# Altium footprint library AltiumDesignerLibraries.PcbLib: 313 footprints (part 6 of 20)
Each footprint in its own frame and in the unit in brackets; x right, y up, seen from the top. Pads: shape width x height; smd on the part's side, far side on the other; paste and mask are expansions set on the pad; w line width, h text height; cw(c..) or ccw(c..) is an arc to the next point about the centre after c.
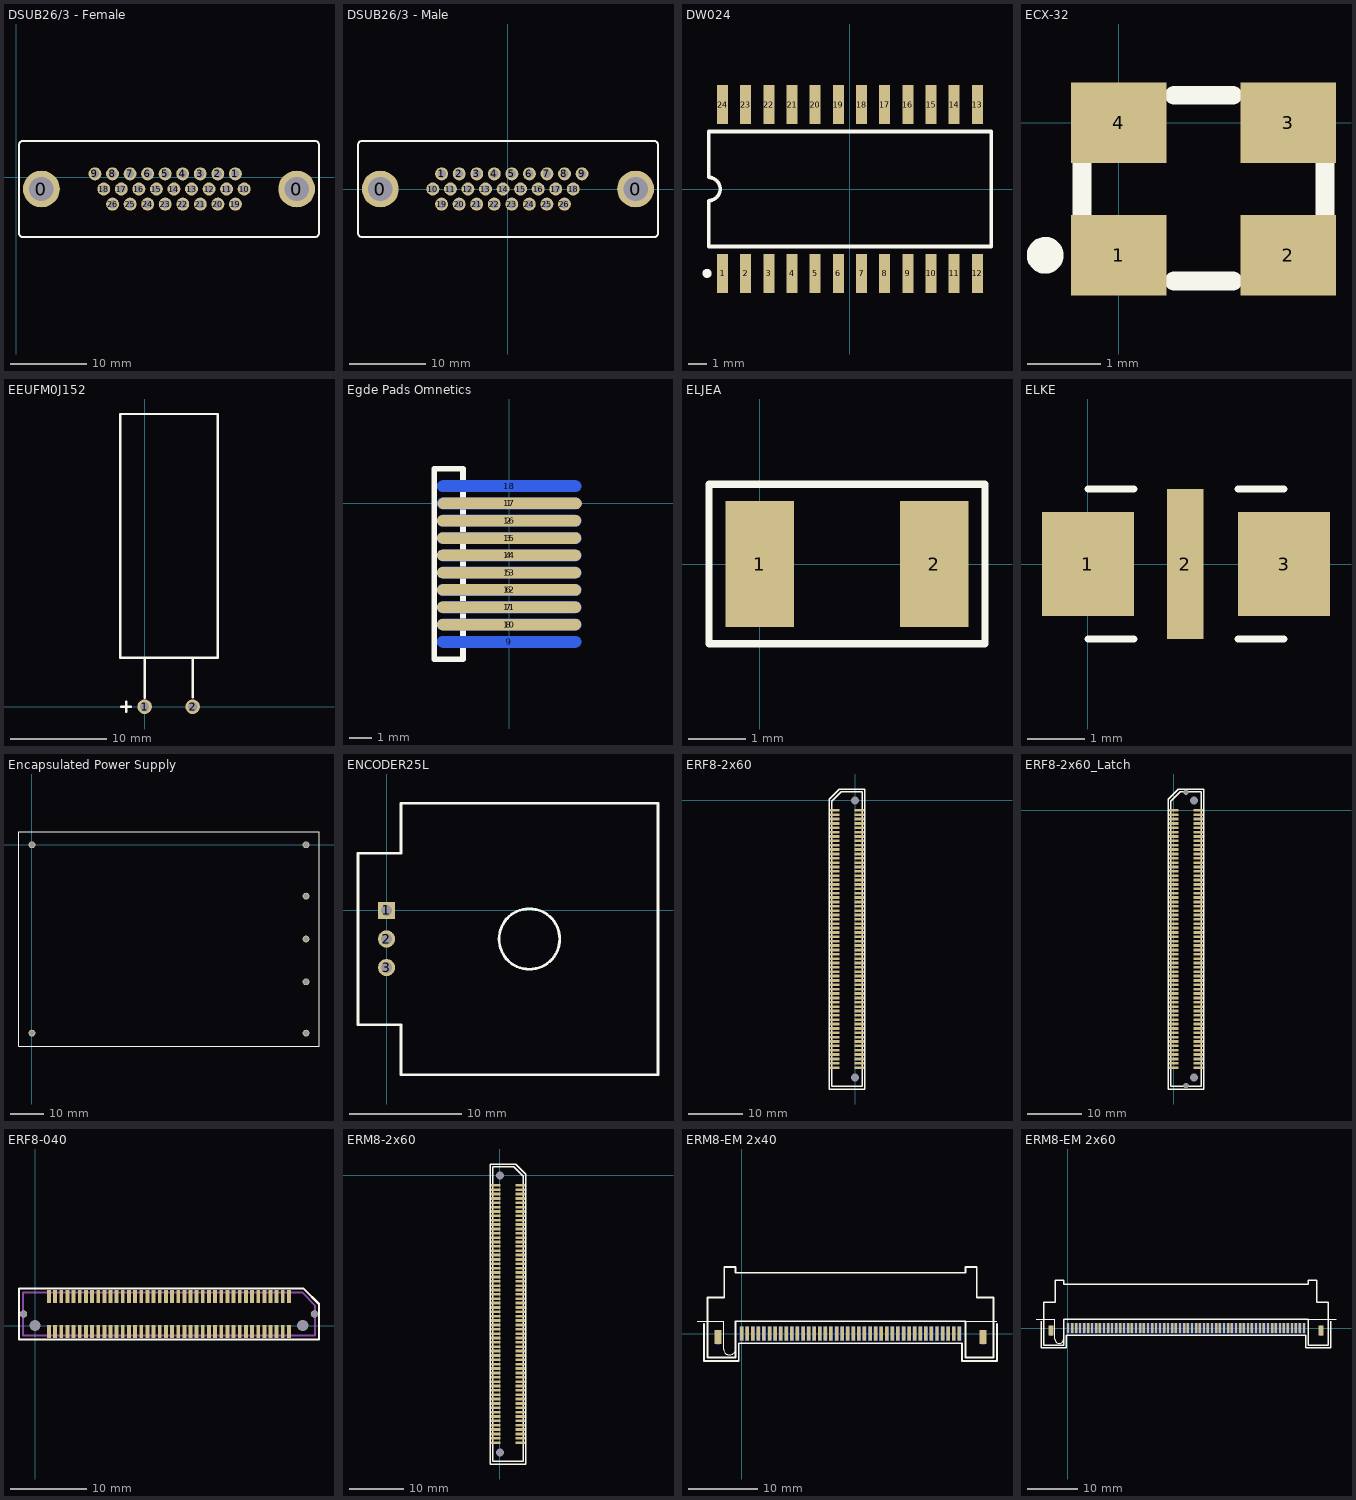
[diagram p5: the footprints below, top view; thin cyan lines are the x and y axes]

## DSUB26/3 - Female [mm]
pads (28):
  round 4.8 hole 3.18: 0(3.304,-1.549) 0(36.624,-1.549)
  round 1.69 hole 1.09: 1(28.614,0.431) 2(26.324,0.431) 3(24.034,0.431) 4(21.744,0.431) 5(19.454,0.431) 6(17.164,0.431) 7(14.874,0.431) 8(12.584,0.431) 9(10.294,0.431) 10(29.764,-1.549) 11(27.474,-1.549) 12(25.184,-1.549) 13(22.894,-1.549) 14(20.604,-1.549) 15(18.314,-1.549) 16(16.024,-1.549) 17(13.734,-1.549) 18(11.444,-1.549) 19(28.624,-3.529) 20(26.334,-3.529) 21(24.044,-3.529) 22(21.754,-3.529) 23(19.464,-3.529) 24(17.174,-3.529) 25(14.884,-3.529) 26(12.594,-3.529)
Top Overlay:
  lines w0.254: 0.38,-7.341 ccw(c0.864,-7.341) 0.889,-7.823 ; 0.381,4.19 cw(c0.902,4.204) 0.889,4.724 ; 0.394,-7.316 0.394,4.218 ; 0.902,-7.824 39.026,-7.824 ; 0.902,4.726 39.026,4.726 ; 39.014,-7.823 ccw(c39.014,-7.315) 39.522,-7.315 ; 39.014,4.724 cw(c39.027,4.229) 39.522,4.242 ; 39.534,-7.316 39.534,4.218

## DSUB26/3 - Male [mm] "Male connector"
pads (28):
  round 4.8 hole 3.18: 0(-16.66,0) 0(16.66,0)
  round 1.69 hole 1.09: 1(-8.65,1.98) 2(-6.36,1.98) 3(-4.07,1.98) 4(-1.78,1.98) 5(0.51,1.98) 6(2.8,1.98) 7(5.09,1.98) 8(7.38,1.98) 9(9.67,1.98) 10(-9.8,0) 11(-7.51,0) 12(-5.22,0) 13(-2.93,0) 14(-0.64,0) 15(1.65,0) 16(3.94,0) 17(6.23,0) 18(8.52,0) 19(-8.66,-1.98) 20(-6.37,-1.98) 21(-4.08,-1.98) 22(-1.79,-1.98) 23(0.5,-1.98) 24(2.79,-1.98) 25(5.08,-1.98) 26(7.37,-1.98)
Top Overlay:
  lines w0.254: -19.57,-5.767 -19.57,5.767 ; -19.558,-5.766 ccw(c-19.05,-5.766) -19.05,-6.274 ; -19.558,5.791 cw(c-19.063,5.779) -19.05,6.274 ; -19.062,-6.275 19.062,-6.275 ; -19.062,6.275 19.062,6.275 ; 19.075,-6.274 ccw(c19.101,-5.791) 19.584,-5.791 ; 19.075,6.274 cw(c19.063,5.753) 19.583,5.74 ; 19.57,-5.767 19.57,5.767

## DW024 [mm]
pads (24):
  rect 0.6x2.15 smd: 1(-6.985,-4.625) 2(-5.715,-4.625) 3(-4.445,-4.625) 4(-3.175,-4.625) 5(-1.905,-4.625) 6(-0.635,-4.625) 7(0.635,-4.625) 8(1.905,-4.625) 9(3.175,-4.625) 10(4.445,-4.625) 11(5.715,-4.625) 12(6.985,-4.625) 13(6.985,4.625) 14(5.715,4.625) 15(4.445,4.625) 16(3.175,4.625) 17(1.905,4.625) 18(0.635,4.625) 19(-0.635,4.625) 20(-1.905,4.625) 21(-3.175,4.625) 22(-4.445,4.625) 23(-5.715,4.625) 24(-6.985,4.625)
Top Overlay:
  circle w0.25: c-7.835,-4.625 r0.125
  lines w0.2: -7.75,-3.15 -7.75,-0.635 ccw(c-7.75,0) -7.75,0.635 -7.75,3.15 7.75,3.15 7.75,-3.15 -7.75,-3.15

## ECX-32 [mm] "Crystal"
pads (4):
  rect 1.3x1.1 smd: 1(0,-1.8) 2(2.3,-1.8) 3(2.3,0) 4(0,0)
Top Overlay:
  circle w0.25: c-1,-1.8 r0.125
  lines w0.254: -0.5,-2.025 -0.5,0.25 ; 0.75,-2.15 1.55,-2.15 ; 0.75,0.375 1.55,0.375 ; 2.8,-2.025 2.8,0.25

## EEUFM0J152 [mil] "Radial Cap thru-hole mounted on its side"
pads (2):
  round 60 hole 38: 1(0,0) 2(196.85,0)
Top Overlay:
  lines w10: -96,0 -56,0 ; -76,-20 -76,20 ; 0,200 1,199 1,37 ; 197,38 197,196 201,200 ; -100,200 300,200 300,1200 -100,1200 -100,200

## Egde Pads Omnetics [mil]
pads (18):
  oval 250x20 smd: 1(1,0) 2(0,-30) 3(0,-60) 4(0,-90) 5(0,-120) 6(0,-150) 7(0,-180) 8(0,-210)
  oval 250x20 smd far side: 9(0,-240) 10(0,-210) 11(0,-180) 12(0,-150) 13(0,-120) 14(0,-90) 15(0,-60) 16(0,-30) 17(0,0) 18(0,30)
Top Overlay:
  lines w10: -130,-270 -130,60 -80,60 -80,-270 -130,-270

## ELJEA [mm]
pads (2):
  rect 1.2x2.2 smd: 1(0,0) 2(3.048,0)
Top Overlay:
  lines w0.127: -0.889,-1.397 3.937,-1.397 3.937,1.397 -0.889,1.397 -0.889,-1.397

## ELKE [mm]
pads (3):
  rect 1.6x1.8 smd: 1(0,0) 3(3.4,0)
  rect 0.635x2.6 smd: 2(1.69,0)
Top Overlay:
  lines w0.127: 0,-1.3 0.8,-1.3 ; 0,1.3 0.8,1.3 ; 2.6,-1.3 3.4,-1.3 ; 2.6,1.3 3.4,1.3

## Encapsulated Power Supply [mil] "PCB mountable power supply 89mmX63.5mm"
pads (7):
  round 80 hole 60: 1(0,0) 2(0,-2200) 3(3200.79,0) 4(3200.79,-600) 5(3200.79,-1600) 5(3200.79,-1100) 7(3200.79,-2200)
Top Overlay:
  lines w10: -151.57,-2350.39 -151.57,150 3352.36,150 3352.36,-2350.39 -151.57,-2350.39

## ENCODER25L [mil] "Grayhill series 25L rotary encoder"
pads (3):
  rect 60x60 hole 38: 1(0,0)
  round 60 hole 38: 2(0,-100) 3(0,-200)
Top Overlay:
  circle w10: c500,-100 r106.07
  lines w10: -100,-400 -100,200 50,200 50,375 950,375 950,-575 50,-575 50,-400 -100,-400

## ERF8-2x60 [mm]
pads (122):
  rect 1.778x0.5 smd mask+0.05: 1(-3.739,-1.8) 2(0.737,-1.8) 3(-3.739,-2.6) 4(0.737,-2.6) 5(-3.739,-3.4) 6(0.737,-3.4) 7(-3.739,-4.2) 8(0.737,-4.2) 9(-3.739,-5) 10(0.737,-5) 11(-3.739,-5.8) 12(0.737,-5.8) 13(-3.739,-6.6) 14(0.737,-6.6) 15(-3.739,-7.4) 16(0.737,-7.4) 17(-3.739,-8.2) 18(0.737,-8.2) 19(-3.739,-9) 20(0.737,-9) 21(-3.739,-9.8) 22(0.737,-9.8) 23(-3.739,-10.6) 24(0.737,-10.6) 25(-3.739,-11.4) 26(0.737,-11.4) 27(-3.739,-12.2) 28(0.737,-12.2) 29(-3.739,-13) 30(0.737,-13) 31(-3.739,-13.8) 32(0.737,-13.8) 33(-3.739,-14.6) 34(0.737,-14.6) 35(-3.739,-15.4) 36(0.737,-15.4) 37(-3.739,-16.2) 38(0.737,-16.2) 39(-3.739,-17) 40(0.737,-17) 41(-3.739,-17.8) 42(0.737,-17.8) 43(-3.739,-18.6) 44(0.737,-18.6) 45(-3.739,-19.4) 46(0.737,-19.4) 47(-3.739,-20.2) 48(0.737,-20.2) 49(-3.739,-21) 50(0.737,-21) 51(-3.739,-21.8) 52(0.737,-21.8) 53(-3.739,-22.6) 54(0.737,-22.6) 55(-3.739,-23.4) 56(0.737,-23.4) 57(-3.739,-24.2) 58(0.737,-24.2) 59(-3.739,-25) 60(0.737,-25) 61(-3.739,-25.8) 62(0.737,-25.8) 63(-3.739,-26.6) 64(0.737,-26.6) 65(-3.739,-27.4) 66(0.737,-27.4) 67(-3.739,-28.2) 68(0.737,-28.2) 69(-3.739,-29) 70(0.737,-29) 71(-3.739,-29.8) 72(0.737,-29.8) 73(-3.739,-30.6) 74(0.737,-30.6) 75(-3.739,-31.4) 76(0.737,-31.4) 77(-3.739,-32.2) 78(0.737,-32.2) 79(-3.739,-33) 80(0.737,-33) 81(-3.739,-33.8) 82(0.737,-33.8) 83(-3.739,-34.6) 84(0.737,-34.6) 85(-3.739,-35.4) 86(0.737,-35.4) 87(-3.739,-36.2) 88(0.737,-36.2) 89(-3.739,-37) 90(0.737,-37) 91(-3.739,-37.8) 92(0.737,-37.8) 93(-3.739,-38.6) 94(0.737,-38.6) 95(-3.739,-39.4) 96(0.737,-39.4) 97(-3.739,-40.2) 98(0.737,-40.2) 99(-3.739,-41) 100(0.737,-41) 101(-3.739,-41.8) 102(0.737,-41.8) 103(-3.739,-42.6) 104(0.737,-42.6) 105(-3.739,-43.4) 106(0.737,-43.4) 107(-3.739,-44.2) 108(0.737,-44.2) 109(-3.739,-45) 110(0.737,-45) 111(-3.739,-45.8) 112(0.737,-45.8) 113(-3.739,-46.6) 114(0.737,-46.6) 115(-3.739,-47.4) 116(0.737,-47.4) 117(-3.739,-48.2) 118(0.737,-48.2) 119(-3.739,-49) 120(0.737,-49)
  round 0 hole 1.45 unplated mask+0.975: 121(0,0) 122(0,-50.8)
Top Overlay:
  lines w0.25: -4.8,-52.908 -4.8,0.2 -2.9,2.108 1.8,2.108 1.8,-52.908 -4.8,-52.908 ; -4.3,-52.4 -4.3,-0.1 -2.6,1.6 1.3,1.6 1.3,-52.4 -4.3,-52.4

## ERF8-2x60_Latch [mm] "Female high density header 120 positions"
pads (124):
  rect 1.778x0.5 smd mask+0.05: 1(0,0) 2(4.476,0) 3(0,-0.8) 4(4.476,-0.8) 5(0,-1.6) 6(4.476,-1.6) 7(0,-2.4) 8(4.476,-2.4) 9(0,-3.2) 10(4.476,-3.2) 11(0,-4) 12(4.476,-4) 13(0,-4.8) 14(4.476,-4.8) 15(0,-5.6) 16(4.476,-5.6) 17(0,-6.4) 18(4.476,-6.4) 19(0,-7.2) 20(4.476,-7.2) 21(0,-8) 22(4.476,-8) 23(0,-8.8) 24(4.476,-8.8) 25(0,-9.6) 26(4.476,-9.6) 27(0,-10.4) 28(4.476,-10.4) 29(0,-11.2) 30(4.476,-11.2) 31(0,-12) 32(4.476,-12) 33(0,-12.8) 34(4.476,-12.8) 35(0,-13.6) 36(4.476,-13.6) 37(0,-14.4) 38(4.476,-14.4) 39(0,-15.2) 40(4.476,-15.2) 41(0,-16) 42(4.476,-16) 43(0,-16.8) 44(4.476,-16.8) 45(0,-17.6) 46(4.476,-17.6) 47(0,-18.4) 48(4.476,-18.4) 49(0,-19.2) 50(4.476,-19.2) 51(0,-20) 52(4.476,-20) 53(0,-20.8) 54(4.476,-20.8) 55(0,-21.6) 56(4.476,-21.6) 57(0,-22.4) 58(4.476,-22.4) 59(0,-23.2) 60(4.476,-23.2) 61(0,-24) 62(4.476,-24) 63(0,-24.8) 64(4.476,-24.8) 65(0,-25.6) 66(4.476,-25.6) 67(0,-26.4) 68(4.476,-26.4) 69(0,-27.2) 70(4.476,-27.2) 71(0,-28) 72(4.476,-28) 73(0,-28.8) 74(4.476,-28.8) 75(0,-29.6) 76(4.476,-29.6) 77(0,-30.4) 78(4.476,-30.4) 79(0,-31.2) 80(4.476,-31.2) 81(0,-32) 82(4.476,-32) 83(0,-32.8) 84(4.476,-32.8) 85(0,-33.6) 86(4.476,-33.6) 87(0,-34.4) 88(4.476,-34.4) 89(0,-35.2) 90(4.476,-35.2) 91(0,-36) 92(4.476,-36) 93(0,-36.8) 94(4.476,-36.8) 95(0,-37.6) 96(4.476,-37.6) 97(0,-38.4) 98(4.476,-38.4) 99(0,-39.2) 100(4.476,-39.2) 101(0,-40) 102(4.476,-40) 103(0,-40.8) 104(4.476,-40.8) 105(0,-41.6) 106(4.476,-41.6) 107(0,-42.4) 108(4.476,-42.4) 109(0,-43.2) 110(4.476,-43.2) 111(0,-44) 112(4.476,-44) 113(0,-44.8) 114(4.476,-44.8) 115(0,-45.6) 116(4.476,-45.6) 117(0,-46.4) 118(4.476,-46.4) 119(0,-47.2) 120(4.476,-47.2)
  round 0 hole 1.45 unplated mask+0.975: 121(3.739,1.8) 122(3.739,-49)
  round 0.94 hole 0.889 unplated: 123(2.235,-50.495) 123(2.235,3.302)
Top Overlay:
  lines w0.25: -1.061,-51.108 5.539,-51.108 5.539,3.908 0.839,3.908 -1.061,2 -1.061,-51.108 ; -0.561,-50.6 5.039,-50.6 5.039,3.4 1.139,3.4 -0.561,1.7 -0.561,-50.6
3D body: height 5.42, standoff -1.07, extent -0.783,-50.603 5.217,3.397

## ERF8-040 [mm]
pads (84):
  rect 0.5x1.7 smd mask+0.05: 1(33,3.75) 2(33,-0.75) 3(32.2,3.75) 4(32.2,-0.75) 5(31.4,3.75) 6(31.4,-0.75) 7(30.6,3.75) 8(30.6,-0.75) 9(29.8,3.75) 10(29.8,-0.75) 11(29,3.75) 12(29,-0.75) 13(28.2,3.75) 14(28.2,-0.75) 15(27.4,3.75) 16(27.4,-0.75) 17(26.6,3.75) 18(26.6,-0.75) 19(25.8,3.75) 20(25.8,-0.75) 21(25,3.75) 22(25,-0.75) 23(24.2,3.75) 24(24.2,-0.75) 25(23.4,3.75) 26(23.4,-0.75) 27(22.6,3.75) 28(22.6,-0.75) 29(21.8,3.75) 30(21.8,-0.75) 31(21,3.75) 32(21,-0.75) 33(20.2,3.75) 34(20.2,-0.75) 35(19.4,3.75) 36(19.4,-0.75) 37(18.6,3.75) 38(18.6,-0.75) 39(17.8,3.75) 40(17.8,-0.75) 41(17,3.75) 42(17,-0.75) 43(16.2,3.75) 44(16.2,-0.75) 45(15.4,3.75) 46(15.4,-0.75) 47(14.6,3.75) 48(14.6,-0.75) 49(13.8,3.75) 50(13.8,-0.75) 51(13,3.75) 52(13,-0.75) 53(12.2,3.75) 54(12.2,-0.75) 55(11.4,3.75) 56(11.4,-0.75) 57(10.6,3.75) 58(10.6,-0.75) 59(9.8,3.75) 60(9.8,-0.75) 61(9,3.75) 62(9,-0.75) 63(8.2,3.75) 64(8.2,-0.75) 65(7.4,3.75) 66(7.4,-0.75) 67(6.6,3.75) 68(6.6,-0.75) 69(5.8,3.75) 70(5.8,-0.75) 71(5,3.75) 72(5,-0.75) 73(4.2,3.75) 74(4.2,-0.75) 75(3.4,3.75) 76(3.4,-0.75) 77(2.6,3.75) 78(2.6,-0.75) 79(1.8,3.75) 80(1.8,-0.75)
  round 0 hole 1.45 unplated: 81(34.8,0) 82(0,0)
  round 0.94 hole 0.889: 83(36.302,1.504) 84(-1.504,1.502)
Top Overlay:
  lines w0.25: -2.099,-1.8 -2.099,4.8 34.9,4.8 36.908,2.8 36.908,-1.8 -2.099,-1.8
Mechanical 2:
  lines w0.25: -1.6,-1.3 -1.6,4.3 34.7,4.3 36.4,2.6 36.4,-1.3 -1.6,-1.3

## ERM8-2x60 [mm] "Mirco Backplane header"
pads (122):
  rect 1.778x0.5 smd mask+0.05: 1(3.739,-1.8) 2(-0.737,-1.8) 3(3.739,-2.6) 4(-0.737,-2.6) 5(3.739,-3.4) 6(-0.737,-3.4) 7(3.739,-4.2) 8(-0.737,-4.2) 9(3.739,-5) 10(-0.737,-5) 11(3.739,-5.8) 12(-0.737,-5.8) 13(3.739,-6.6) 14(-0.737,-6.6) 15(3.739,-7.4) 16(-0.737,-7.4) 17(3.739,-8.2) 18(-0.737,-8.2) 19(3.739,-9) 20(-0.737,-9) 21(3.739,-9.8) 22(-0.737,-9.8) 23(3.739,-10.6) 24(-0.737,-10.6) 25(3.739,-11.4) 26(-0.737,-11.4) 27(3.739,-12.2) 28(-0.737,-12.2) 29(3.739,-13) 30(-0.737,-13) 31(3.739,-13.8) 32(-0.737,-13.8) 33(3.739,-14.6) 34(-0.737,-14.6) 35(3.739,-15.4) 36(-0.737,-15.4) 37(3.739,-16.2) 38(-0.737,-16.2) 39(3.739,-17) 40(-0.737,-17) 41(3.739,-17.8) 42(-0.737,-17.8) 43(3.739,-18.6) 44(-0.737,-18.6) 45(3.739,-19.4) 46(-0.737,-19.4) 47(3.739,-20.2) 48(-0.737,-20.2) 49(3.739,-21) 50(-0.737,-21) 51(3.739,-21.8) 52(-0.737,-21.8) 53(3.739,-22.6) 54(-0.737,-22.6) 55(3.739,-23.4) 56(-0.737,-23.4) 57(3.739,-24.2) 58(-0.737,-24.2) 59(3.739,-25) 60(-0.737,-25) 61(3.739,-25.8) 62(-0.737,-25.8) 63(3.739,-26.6) 64(-0.737,-26.6) 65(3.739,-27.4) 66(-0.737,-27.4) 67(3.739,-28.2) 68(-0.737,-28.2) 69(3.739,-29) 70(-0.737,-29) 71(3.739,-29.8) 72(-0.737,-29.8) 73(3.739,-30.6) 74(-0.737,-30.6) 75(3.739,-31.4) 76(-0.737,-31.4) 77(3.739,-32.2) 78(-0.737,-32.2) 79(3.739,-33) 80(-0.737,-33) 81(3.739,-33.8) 82(-0.737,-33.8) 83(3.739,-34.6) 84(-0.737,-34.6) 85(3.739,-35.4) 86(-0.737,-35.4) 87(3.739,-36.2) 88(-0.737,-36.2) 89(3.739,-37) 90(-0.737,-37) 91(3.739,-37.8) 92(-0.737,-37.8) 93(3.739,-38.6) 94(-0.737,-38.6) 95(3.739,-39.4) 96(-0.737,-39.4) 97(3.739,-40.2) 98(-0.737,-40.2) 99(3.739,-41) 100(-0.737,-41) 101(3.739,-41.8) 102(-0.737,-41.8) 103(3.739,-42.6) 104(-0.737,-42.6) 105(3.739,-43.4) 106(-0.737,-43.4) 107(3.739,-44.2) 108(-0.737,-44.2) 109(3.739,-45) 110(-0.737,-45) 111(3.739,-45.8) 112(-0.737,-45.8) 113(3.739,-46.6) 114(-0.737,-46.6) 115(3.739,-47.4) 116(-0.737,-47.4) 117(3.739,-48.2) 118(-0.737,-48.2) 119(3.739,-49) 120(-0.737,-49)
  round 0 hole 1.45 unplated mask+0.975: 121(0,0) 122(0,-50.8)
Top Overlay:
  lines w0.25: -1.8,-52.908 -1.8,2.108 2.9,2.108 4.8,0.2 4.8,-52.908 -1.8,-52.908 ; -1.3,-52.4 -1.3,1.6 2.6,1.6 4.3,-0.1 4.3,-52.4 -1.3,-52.4

## ERM8-EM 2x40 [mm] "Edge Mount Male high density backplane connector"
pads (84):
  rect 0.5x2 smd far side mask+0.05: 1(0,0) 3(0.8,0) 5(1.6,0) 7(2.4,0) 9(3.2,0) 11(4,0) 13(4.8,0) 15(5.6,0) 17(6.4,0) 19(7.2,0) 21(8,0) 23(8.8,0) 25(9.6,0) 27(10.4,0) 29(11.2,0) 31(12,0) 33(12.8,0) 35(13.6,0) 37(14.4,0) 39(15.2,0) 41(16,0) 43(16.8,0) 45(17.6,0) 47(18.4,0) 49(19.2,0) 51(20,0) 53(20.8,0) 55(21.6,0) 57(22.4,0) 59(23.2,0) 61(24,0) 63(24.8,0) 65(25.6,0) 67(26.4,0) 69(27.2,0) 71(28,0) 73(28.8,0) 75(29.6,0) 77(30.4,0) 79(31.2,0) 81(-3.4,-0.5) 83(34.6,-0.5)
  rect 0.5x2 smd mask+0.05: 2(0,0) 4(0.8,0) 6(1.6,0) 8(2.4,0) 10(3.2,0) 12(4,0) 14(4.8,0) 16(5.6,0) 18(6.4,0) 20(7.2,0) 22(8,0) 24(8.8,0) 26(9.6,0) 28(10.4,0) 30(11.2,0) 32(12,0) 34(12.8,0) 36(13.6,0) 38(14.4,0) 40(15.2,0) 42(16,0) 44(16.8,0) 46(17.6,0) 48(18.4,0) 50(19.2,0) 52(20,0) 54(20.8,0) 56(21.6,0) 58(22.4,0) 60(23.2,0) 62(24,0) 64(24.8,0) 66(25.6,0) 68(26.4,0) 70(27.2,0) 72(28,0) 74(28.8,0) 76(29.6,0) 78(30.4,0) 80(31.2,0)
  rect 1x2 smd mask+0.05: 82(-3.4,-0.5) 84(34.6,-0.5)
Top Overlay:
  lines w0: -6.4,1.8 -2.6,1.8 -2.6,-2.2 ccw(c-1.75,-2.2) -0.9,-2.2 -0.9,1.8 36.6,1.8
  lines w0.254: 32.1,-3.425 32.1,1.775 ; -5.4,-3.9 -0.4,-3.9 ; -5.4,-3.9 -5.4,1.423 -5.4,-3.9 ; -5.4,-3.9 -0.4,-3.9 ; -0.4,-3.9 -0.4,-1.38 31.6,-1.38 ; 31.6,-3.9 36.6,-3.9 ; 31.6,-3.9 31.6,-1.38 ; 31.6,-3.9 36.6,-3.9 ; 31.6,-3.9 31.6,-1.38 ; 36.6,-3.9 36.6,1.423 36.6,-3.9 ; -4.9,-3.4 -4.9,5.2 -2.5,5.2 -2.5,9.55 -0.9,9.55 -0.9,8.75 32.1,8.75 32.1,9.55 33.7,9.55 33.7,5.2 36.1,5.2 36.1,-3.4 32.1,-3.4 32.1,1.8 -0.9,1.8 -0.9,-3.4 -4.9,-3.4

## ERM8-EM 2x60 [mm] "Edge Mount Male high density backplane connector"
pads (124):
  rect 0.5x2 smd far side mask+0.05: 1(0,0) 3(0.8,0) 5(1.6,0) 7(2.4,0) 9(3.2,0) 11(4,0) 13(4.8,0) 15(5.6,0) 17(6.4,0) 19(7.2,0) 21(8,0) 23(8.8,0) 25(9.6,0) 27(10.4,0) 29(11.2,0) 31(12,0) 33(12.8,0) 35(13.6,0) 37(14.4,0) 39(15.2,0) 41(16,0) 43(16.8,0) 45(17.6,0) 47(18.4,0) 49(19.2,0) 51(20,0) 53(20.8,0) 55(21.6,0) 57(22.4,0) 59(23.2,0) 61(24,0) 63(24.8,0) 65(25.6,0) 67(26.4,0) 69(27.2,0) 71(28,0) 73(28.8,0) 75(29.6,0) 77(30.4,0) 79(31.2,0) 81(32,0) 83(32.8,0) 85(33.6,0) 87(34.4,0) 89(35.2,0) 91(36,0) 93(36.8,0) 95(37.6,0) 97(38.4,0) 99(39.2,0) 101(40,0) 103(40.8,0) 105(41.6,0) 107(42.4,0) 109(43.2,0) 111(44,0) 113(44.8,0) 115(45.6,0) 117(46.4,0) 119(47.2,0) 121(-3.4,-0.5) 123(50.6,-0.5)
  rect 0.5x2 smd mask+0.05: 2(0,0) 4(0.8,0) 6(1.6,0) 8(2.4,0) 10(3.2,0) 12(4,0) 14(4.8,0) 16(5.6,0) 18(6.4,0) 20(7.2,0) 22(8,0) 24(8.8,0) 26(9.6,0) 28(10.4,0) 30(11.2,0) 32(12,0) 34(12.8,0) 36(13.6,0) 38(14.4,0) 40(15.2,0) 42(16,0) 44(16.8,0) 46(17.6,0) 48(18.4,0) 50(19.2,0) 52(20,0) 54(20.8,0) 56(21.6,0) 58(22.4,0) 60(23.2,0) 62(24,0) 64(24.8,0) 66(25.6,0) 68(26.4,0) 70(27.2,0) 72(28,0) 74(28.8,0) 76(29.6,0) 78(30.4,0) 80(31.2,0) 82(32,0) 84(32.8,0) 86(33.6,0) 88(34.4,0) 90(35.2,0) 92(36,0) 94(36.8,0) 96(37.6,0) 98(38.4,0) 100(39.2,0) 102(40,0) 104(40.8,0) 106(41.6,0) 108(42.4,0) 110(43.2,0) 112(44,0) 114(44.8,0) 116(45.6,0) 118(46.4,0) 120(47.2,0)
  rect 1x2 smd mask+0.05: 122(-3.4,-0.5) 124(50.6,-0.5)
Top Overlay:
  lines w0: -6.4,1.8 -2.6,1.8 -2.6,-2.2 ccw(c-1.75,-2.2) -0.9,-2.2 -0.9,1.8 53.6,1.8
  lines w0.254: -5.4,-3.9 -5.4,1.423 -5.4,-3.9 ; -5.4,-3.9 -0.4,-3.9 ; -5.4,-3.9 -0.4,-3.9 ; -0.4,-3.9 -0.4,-1.38 ; -0.4,-3.9 -0.4,-1.38 ; -0.4,-1.38 47.6,-1.38 ; -0.4,-1.38 47.6,-1.38 ; 47.6,-3.9 47.6,-1.38 ; 47.6,-3.9 52.6,-3.9 ; 47.6,-3.9 47.6,-1.38 ; 47.6,-3.9 52.6,-3.9 ; 52.6,-3.9 52.6,1.423 52.6,-3.9 ; -4.9,-3.4 -0.9,-3.4 -0.9,1.8 48.1,1.8 48.1,-3.4 52.1,-3.4 52.1,5.2 49.7,5.2 49.7,9.55 48.1,9.55 48.1,8.75 -0.9,8.75 -0.9,9.55 -2.5,9.55 -2.5,5.2 -4.9,5.2 -4.9,-3.4